# Altium footprint library SwagePCB.PcbLib: 114 footprints (part 3 of 8)
Each footprint in its own frame and in the unit in brackets; x right, y up, seen from the top. Pads: shape width x height; smd on the part's side, far side on the other; paste and mask are expansions set on the pad; w line width, h text height; cw(c..) or ccw(c..) is an arc to the next point about the centre after c.
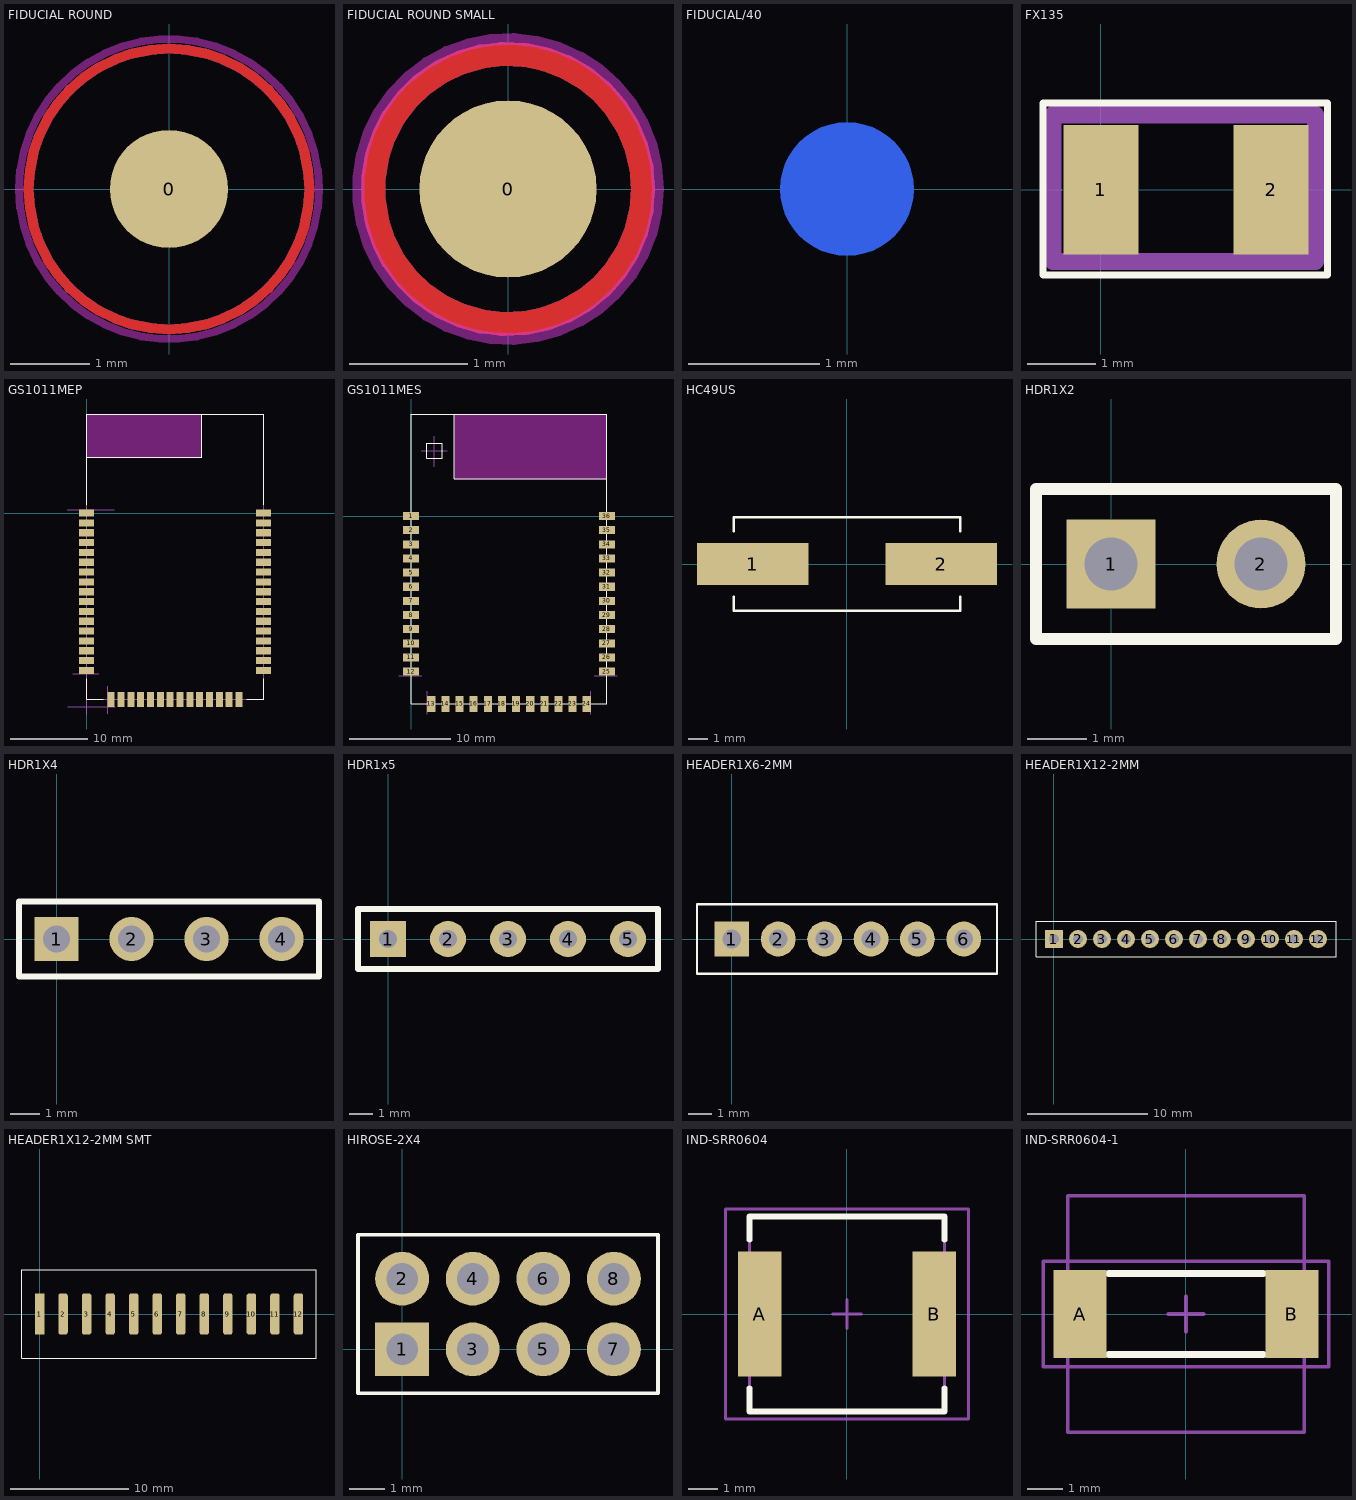
[diagram p2: the footprints below, top view; thin cyan lines are the x and y axes]

## FIDUCIAL ROUND [mm] "FIDUCIAL ROUND"
pads (1):
  round 1.5 all layers, no hole paste+0 mask+1.1: 0(0,0)
Top Layer:
  circle w0.127: c0,0 r1.778
Bottom Layer:
  circle w0.127: c0,0 r1.778
Keep-Out Layer:
  circle w0.1: c0,0 r1.9

## FIDUCIAL ROUND SMALL [mm] "FIDUCIAL ROUND"
pads (1):
  round 1.5 all layers, no hole paste+0 mask+0.559: 0(0,0)
Top Layer:
  circle w0.203: c0,0 r1.143
Bottom Layer:
  circle w0.203: c0,0 r1.143
Keep-Out Layer:
  circle w0.1: c0,0 r1.27

## FIDUCIAL/40 [mil]
pads (1):
  round 40 smd far side: ""(0,0)
Bottom Overlay:
  circle w8: c0,0 r45
Bottom Solder:
  circle w12: c0,0 r25
  circle w12: c0,0 r24
  lines w50: 0,-5 0,5

## FX135 [mm] "Crystal, SMD, 3.2mm x 1.5mm, Low Profile"
height 0.9
pads (2):
  rect 1.1x1.9 smd: 1(0,0) 2(2.5,0)
Top Overlay:
  lines w0.102: -0.85,-1.25 -0.85,1.275 3.325,1.275 3.325,-1.25 -0.85,-1.25
Mechanical 13:
  lines w0.254: -0.7,-1.05 3.15,-1.05 ; -0.7,-0.95 -0.7,1.1 3.15,1.1 3.15,-1
3D body: height 0.9, standoff 0, extent -0.55,-0.95 3.05,0.95

## GS1011MEP [mil] "Wifi Module, Gainspan"
pads (48):
  rect 75x36 smd: 1(0,0) 2(0,-50) 3(0,-100) 4(0,-150) 5(0,-200) 6(0,-250) 7(0,-300) 8(0,-350) 9(0,-400) 10(0,-450) 11(0,-500) 12(0,-550) 13(0,-600) 14(0,-650) 15(0,-700) 16(0,-750) 17(0,-800) 32(900,-800) 33(900,-750) 34(900,-700) 35(900,-650) 36(900,-600) 37(900,-550) 38(900,-500) 39(900,-450) 40(900,-400) 41(900,-350) 42(900,-300) 43(900,-250) 44(900,-200) 45(900,-150) 46(900,-100) 47(900,-50) 48(900,0)
  rect 36x75 smd: 18(125,-947.5) 19(175,-947.5) 20(225,-947.5) 21(275,-947.5) 22(325,-947.5) 23(375,-947.5) 24(425,-947.5) 25(475,-947.5) 26(525,-947.5) 27(575,-947.5) 28(625,-947.5) 29(675,-947.5) 30(725,-947.5) 31(775,-947.5)
Top Overlay:
  lines w4: 0,-842.5 0,-947.5 85,-947.5 ; 0,42.5 0,504 900,504 900,42.5 ; 0,284 586,284 586,504 ; 815,-947.5 900,-947.5 900,-842.5
Keep-Out Layer:
  region: 0,284 586,284 586,504 0,504
Mechanical 3:
  lines w4: -99,18 142,18 ; -96,-985 145,-985 ; -70,-818 61.34,-818 ; 0,-1021.5 0,-947.5 ; 107,-1019.5 107,-880.5
Mechanical 5:
  lines w4: -0.01,283.98 585.99,283.98 585.99,503.98 ; -0.01,-947.52 -0.01,503.98 899.99,503.98 899.99,-947.52 -0.01,-947.52

## GS1011MES [mm] "Wifi Module, Gainspan"
pads (36):
  rect 1.6x0.8 all layers, no hole: 1(0,0) 2(0,-1.4) 3(0,-2.8) 4(0,-4.2) 5(0,-5.6) 6(0,-7) 7(0,-8.4) 8(0,-9.8) 9(0,-11.2) 10(0,-12.6) 11(0,-14) 12(0,-15.4) 25(19.4,-15.4) 26(19.4,-14) 27(19.4,-12.6) 28(19.4,-11.2) 29(19.4,-9.8) 30(19.4,-8.4) 31(19.4,-7) 32(19.4,-5.6) 33(19.4,-4.2) 34(19.4,-2.8) 35(19.4,-1.4) 36(19.4,0)
  rect 0.8x1.6 all layers, no hole: 13(2,-18.6) 14(3.4,-18.6) 15(4.8,-18.6) 16(6.2,-18.6) 17(7.6,-18.6) 18(9,-18.6) 19(10.4,-18.6) 20(11.8,-18.6) 21(13.2,-18.6) 22(14.6,-18.6) 23(16,-18.6) 24(17.4,-18.6)
Top Overlay:
  lines w0.102: 4.3,10.1 4.3,3.7 19.4,3.7 ; 0,-18.6 19.4,-18.6 19.4,10.1 0,10.1 0,-18.6 ; 1.57,5.71 3.07,5.71 3.07,7.21 1.57,7.21 1.57,5.71
Keep-Out Layer:
  region: 4.32,9.1 4.318,9.098 4.318,3.701 19.4,3.701 19.4,10.1 4.32,10.1
  lines w0.102: 4.318,3.701 19.4,3.701 19.4,10.1 4.32,10.1 4.318,10.102 4.318,3.701
Mechanical 3:
  lines w0.102: -1.225,-15.8 1.05,-15.8 ; 1,6.46 3.6,6.46 ; 1.6,-19.6 1.6,-17.325 ; 2.32,4.9 2.32,7.9 ; 17.8,-19.6 17.8,-17.325 ; 18.15,-15.8 20.425,-15.8

## HC49US [mm] "HC49US SMD Low Profile Crystal"
height 4.2
pads (2):
  rect 5.6x2.1 smd: 1(-4.75,0) 2(4.75,0)
Top Overlay:
  lines w0.127: -5.7,-1.651 -5.7,-2.35 5.7,-2.35 5.7,-1.651 ; -5.7,1.651 -5.7,2.35 5.7,2.35 5.7,1.651
3D body: height 4.2, standoff 0, extent -5.715,-2.337 5.69,2.337

## HDR1X2 [mm] "Connector; Header; 2 Position"
pads (2):
  rect 1.5x1.5 hole 0.9: 1(0,0)
  round 1.5 hole 0.9: 2(2.54,0)
Top Overlay:
  lines w0.2: -1.27,-1.27 -1.27,1.27 3.81,1.27 3.81,-1.27 -1.27,-1.27

## HDR1X4 [mm] "Connector; Header; 4 Position"
pads (4):
  rect 1.5x1.5 hole 0.9: 1(0,0)
  round 1.5 hole 0.9: 2(2.54,0) 3(5.08,0) 4(7.62,0)
Top Overlay:
  lines w0.2: -1.27,-1.27 -1.27,1.27 8.89,1.27 8.89,-1.27 -1.27,-1.27

## HDR1x5 [mil]
pads (5):
  rect 60x60 hole 30: 1(0,0)
  round 60 hole 30: 2(100,0) 3(200,0) 4(300,0) 5(400,0)
Top Overlay:
  lines w10: -50,-50 -50,50 450,50 450,-50 -50,-50

## HEADER1X6-2MM [mm] "Connector, Header, 1x6 positions, Male, 2mm pitch"
pads (6):
  rect 1.5x1.5 hole 0.8: 1(0,0)
  round 1.5 hole 0.8: 2(2,0) 3(4,0) 4(6,0) 5(8,0) 6(10,0)
Top Overlay:
  lines w0.102: -1.5,-1.5 -1.5,1.5 11.43,1.5 11.43,-1.5 -1.5,-1.5

## HEADER1X12-2MM [mm] "Connector, Header, 1x12 positions, Male, 2mm pitch"
pads (12):
  rect 1.5x1.5 hole 0.8: 1(0,0)
  round 1.5 hole 0.8: 2(2,0) 3(4,0) 4(6,0) 5(8,0) 6(10,0) 7(12,0) 8(14,0) 9(16,0) 10(18,0) 11(20,0) 12(22,0)
Top Overlay:
  lines w0.102: -1.5,-1.5 -1.5,1.5 23.5,1.5 23.5,-1.5 -1.5,-1.5

## HEADER1X12-2MM SMT [mm] "Connector, Header, 1x12 positions, Male, 2mm pitch, Surface Mount"
height 6.6
pads (12):
  rect 0.8x3.5 all layers, no hole: 1(0,0)
  rrect50% 0.8x3.5 all layers, no hole: 2(2,0) 3(4,0) 4(6,0) 5(8,0) 6(10,0) 7(12,0) 8(14,0) 9(16,0) 10(18,0) 11(20,0) 12(22,0)
Top Overlay:
  lines w0.102: -1.524,3.75 23.495,3.75 ; -1.5,3.75 -1.5,-3.75 23.5,-3.75 23.5,3.75
3D body: height 6.6, standoff 0, extent -0.787,-3.759 22.733,3.759

## HIROSE-2X4 [mil] "A3D-8DA-2DSE, 2mm pitch, Female"
height 165.35
pads (8):
  rect 60x60 hole 35: 1(0,0)
  round 60 hole 35: 2(0,78.74) 3(78.74,0) 4(78.74,78.74) 5(157.48,0) 6(157.48,78.74) 7(236.22,0) 8(236.22,78.74)
Top Overlay:
  lines w4: -49.21,-49.21 285.43,-49.21 285.43,127.95 -49.21,127.95 -49.21,-49.21
3D body: height 165.35, standoff 0, extent -49.21,-49.21 285.43,127.95

## IND-SRR0604 [mm]
height 4.8
pads (2):
  rect 1.5x4.3 smd: A(-3,0) B(3,0)
Top Overlay:
  lines w0.2: -3.35,-2.55 -3.35,-3.35 3.35,-3.35 3.35,-2.55 ; -3.35,2.55 -3.35,3.35 3.35,3.35 3.35,2.55
Mechanical 13:
  lines w0.1: -3.35,-3.35 -3.35,3.35 3.35,3.35 3.35,-3.35 -3.35,-3.35
Mechanical 15:
  lines w0.1: -0.5,0 0.5,0 ; 0,-0.5 0,0.5 ; -4.175,-3.6 -4.175,3.6 4.175,3.6 4.175,-3.6 -4.175,-3.6
3D body: height 4.8, standoff 0, extent -3.35,-3.35 3.35,3.35

## IND-SRR0604-1 [mm] "Chip Inductor, 2-Leads, Body 6.5x6.5mm, IPC Medium Density"
height 4.8
pads (2):
  rect 1.5x2.5 smd: A(-3,0) B(3,0)
Top Overlay:
  lines w0.2: -2.2,-1.15 2.2,-1.15 ; -2.2,1.15 2.2,1.15
Mechanical 13:
  lines w0.1: -3.35,-3.35 -3.35,3.35 3.35,3.35 3.35,-3.35 -3.35,-3.35
Mechanical 15:
  lines w0.1: -0.5,0 0.5,0 ; 0,-0.5 0,0.5 ; -4.05,-1.5 -4.05,1.5 4.05,1.5 4.05,-1.5 -4.05,-1.5
3D body: height 4.8, standoff 0, extent -3.35,-3.35 3.35,3.35